# Altium footprint library Tomra_Cadstar_Footprints.PcbLib: 373 footprints (part 21 of 24)
Each footprint in its own frame and in the unit in brackets; x right, y up, seen from the top. Pads: shape width x height; smd on the part's side, far side on the other; paste and mask are expansions set on the pad; w line width, h text height; cw(c..) or ccw(c..) is an arc to the next point about the centre after c.
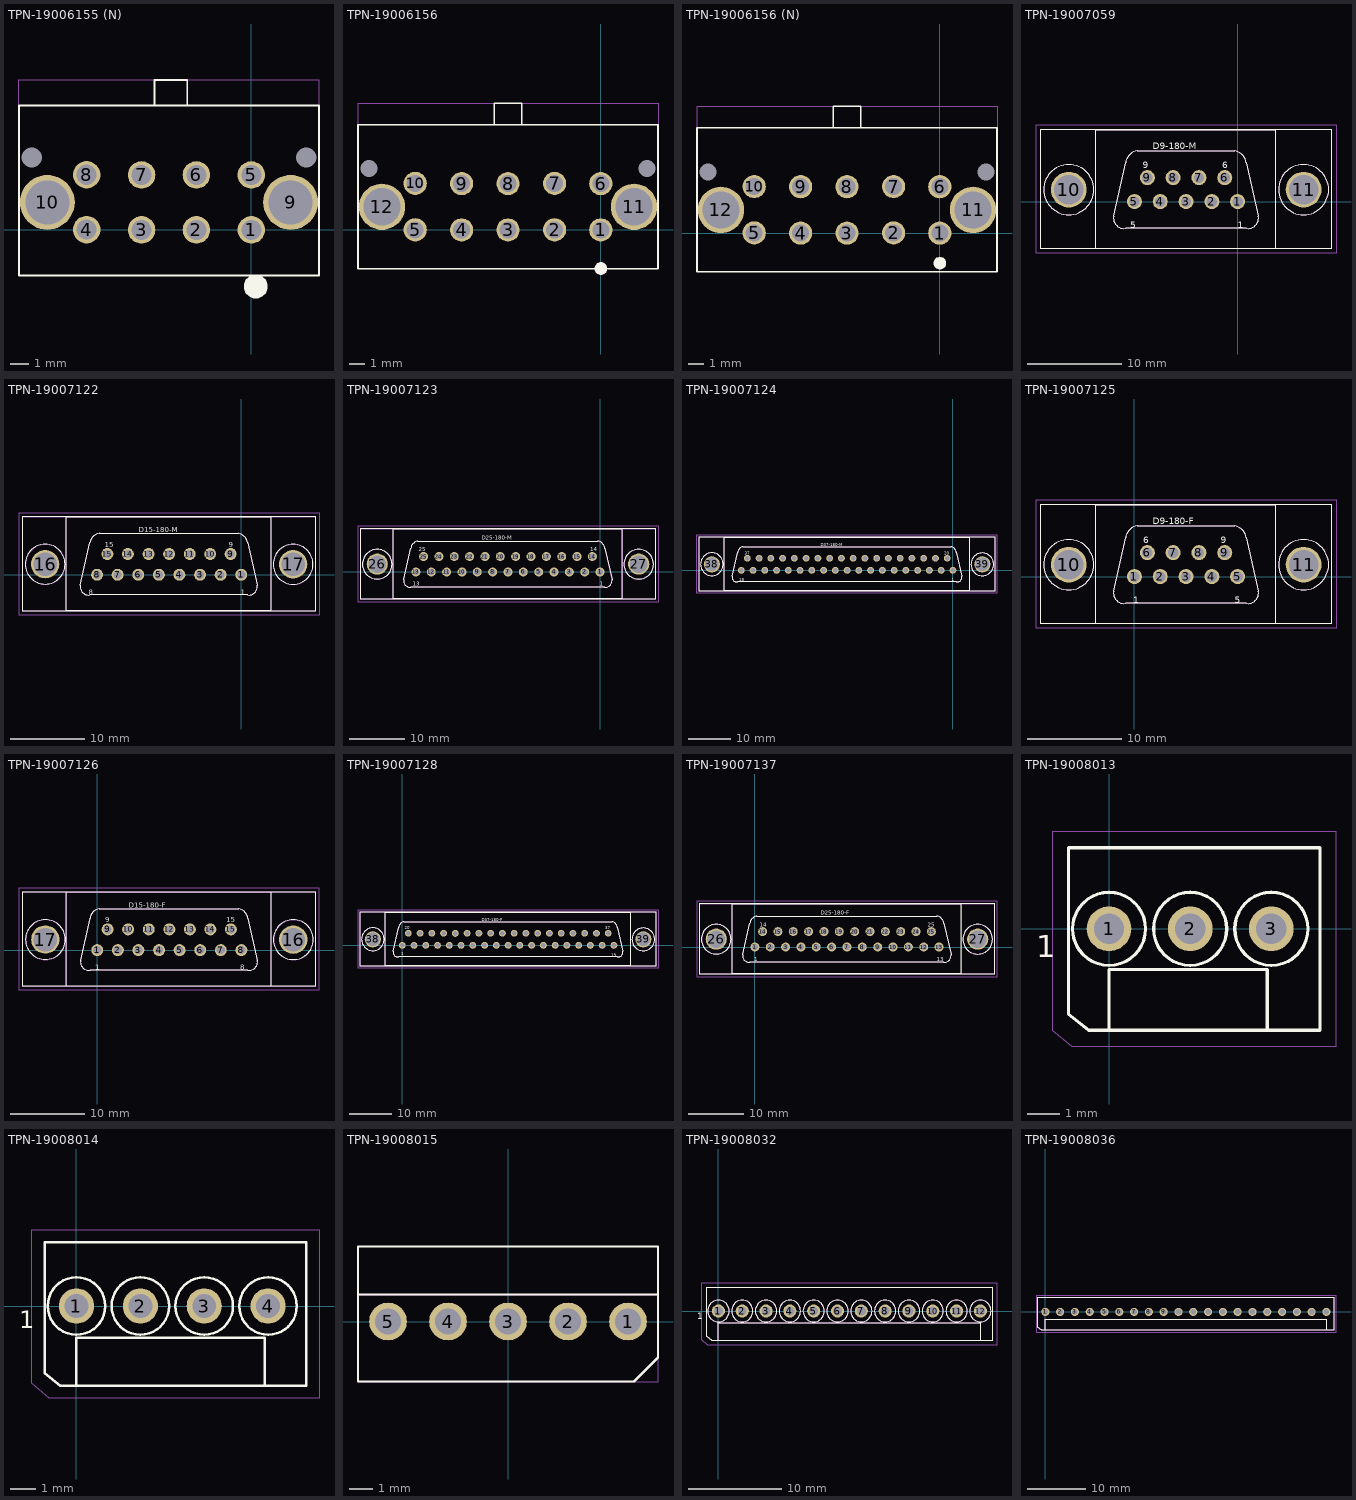
[diagram p20: the footprints below, top view; thin cyan lines are the x and y axes]

## TPN-19006155 (N) [mm]
height 10
pads (12):
  round 1.5 / inner round 1.524 / far side round 1.5 hole 1.1 paste+0 mask+0: 1(0,0) 2(-3,0) 3(-6,0) 4(-9,0.01) 5(0,3) 6(-3,3) 7(-6,3) 8(-9,3.01)
  round 3 / inner round 1.524 / far side round 3 hole 2.4 paste+0 mask+0: 9(2.15,1.5) 10(-11.15,1.5)
  round 0 / inner round 1.524 / far side round 0 hole 1.1 unplated paste+0 mask+0: 11(3,3.96) 12(-12,3.96)
Top Silk:
  region: 0.245,-3.735 0.119,-3.735 -0.115,-3.638 -0.293,-3.46 -0.39,-3.226 -0.39,-2.974 -0.293,-2.74 -0.115,-2.562 0.119,-2.465 0.245,-2.465 0.371,-2.465 0.605,-2.562 0.783,-2.74 0.88,-2.974 0.88,-3.226 0.783,-3.46 0.605,-3.638 0.371,-3.735
  lines w0.1: -12.7,-2.5 3.7,-2.5 3.7,6.8 -12.7,6.8 -12.7,-2.5 ; -5.3,6.8 -3.5,6.8 -3.5,8.2 -5.3,8.2 -5.3,6.8
  text ".Designator" at -12.2,7.3 h0.7
Top Assembly:
  lines w0.05: -12.7,-2.5 3.7,-2.5 3.7,8.2 -12.7,8.2 -12.7,-2.5
Top Placement:
  lines w0.01: -12.7,-2.5 3.7,-2.5 3.7,8.2 -12.7,8.2 -12.7,-2.5

## TPN-19006156 [mm]
height 10
pads (14):
  round 1.5 / inner round 1.524 / far side round 1.5 hole 1.1 paste+0 mask+0: 1(0,0) 2(-2.99,0.01) 3(-6,0) 4(-9,0) 5(-12,0.01) 6(0,3) 7(-2.99,3.01) 8(-6,3) 9(-9,3) 10(-12,3.01)
  round 3 / inner round 1.524 / far side round 3 hole 2.4 paste+0 mask+0: 11(2.15,1.5) 12(-14.15,1.5)
  round 0 / inner round 1.524 / far side round 0 hole 1.1 unplated paste+0 mask+0: 13(3,3.96) 14(-15,3.96)
Top Silk:
  region: 0,-2.9 -0.08,-2.9 -0.227,-2.839 -0.339,-2.727 -0.4,-2.58 -0.4,-2.42 -0.339,-2.273 -0.227,-2.161 -0.08,-2.1 0,-2.1 0.08,-2.1 0.227,-2.161 0.339,-2.273 0.4,-2.42 0.4,-2.58 0.339,-2.727 0.227,-2.839 0.08,-2.9
  lines w0.1: -15.7,-2.5 3.7,-2.5 3.7,6.8 -15.7,6.8 -15.7,-2.5 ; -6.9,6.8 -5.1,6.8 -5.1,8.2 -6.9,8.2 -6.9,6.8
  text ".Designator" at -15.2,7.3 h0.7
Top Assembly:
  lines w0.05: -15.7,-2.5 3.7,-2.5 3.7,8.2 -15.7,8.2 -15.7,-2.5
Top Placement:
  lines w0.01: -15.7,-2.5 3.7,-2.5 3.7,8.2 -15.7,8.2 -15.7,-2.5

## TPN-19006156 (N) [mm]
height 10
pads (14):
  round 1.5 / inner round 1.524 / far side round 1.5 hole 1.1 paste+0 mask+0: 1(0,0) 2(-2.99,0.01) 3(-6,0) 4(-9,0) 5(-12,0.01) 6(0,3) 7(-2.99,3.01) 8(-6,3) 9(-9,3) 10(-12,3.01)
  round 3 / inner round 1.524 / far side round 3 hole 2.4 paste+0 mask+0: 11(2.15,1.5) 12(-14.15,1.5)
  round 0 / inner round 1.524 / far side round 0 hole 1.1 unplated paste+0 mask+0: 13(3,3.96) 14(-15,3.96)
Top Silk:
  region: 0,-2.35 -0.08,-2.35 -0.227,-2.289 -0.339,-2.177 -0.4,-2.03 -0.4,-1.87 -0.339,-1.723 -0.227,-1.611 -0.08,-1.55 0,-1.55 0.08,-1.55 0.227,-1.611 0.339,-1.723 0.4,-1.87 0.4,-2.03 0.339,-2.177 0.227,-2.289 0.08,-2.35
  lines w0.1: -15.7,-2.5 3.7,-2.5 3.7,6.8 -15.7,6.8 -15.7,-2.5 ; -6.9,6.8 -5.1,6.8 -5.1,8.2 -6.9,8.2 -6.9,6.8
  text ".Designator" at -15.2,7.3 h0.7
Top Assembly:
  lines w0.05: -15.7,-2.5 3.7,-2.5 3.7,8.2 -15.7,8.2 -15.7,-2.5
Top Placement:
  lines w0.01: -15.7,-2.5 3.7,-2.5 3.7,8.2 -15.7,8.2 -15.7,-2.5

## TPN-19007059 [mm]
pads (11):
  round 1.6 / inner round 1.524 / far side round 1.6 hole 1.1 paste+0 mask+0: 1(0,0) 2(-2.743,0) 3(-5.486,0) 4(-8.23,0) 5(-10.973,0) 6(-1.372,2.54) 7(-4.115,2.54) 8(-6.858,2.54) 9(-9.601,2.54)
  round 3.8 / inner round 1.524 / far side round 3.8 hole 3.15 paste+0 mask+0: 10(-17.958,1.27) 11(7.01,1.27)
Top Silk:
  lines w0.1: -20.942,-5.011 9.957,-5.011 ; -20.942,-5.011 -20.942,7.689 ; -20.942,-5.011 9.957,-5.011 ; -20.942,-5.011 -20.942,7.689 ; -20.942,7.689 9.957,7.689 ; -20.942,7.689 9.957,7.689 ; -17.958,-1.397 cw(c-17.958,1.27) -17.958,3.937 ; -17.958,-1.397 ccw(c-17.958,1.27) -17.958,3.937 ; -17.958,-1.397 cw(c-17.958,1.27) -17.958,3.937 ; -17.958,-1.397 ccw(c-17.958,1.27) -17.958,3.937 ; -15.1,-4.998 3.988,-4.998 ; -15.1,-4.998 -15.1,7.651 ; -15.1,-4.998 3.988,-4.998 ; -15.1,-4.998 -15.1,7.651 ; -15.1,7.651 3.988,7.651 ; -15.1,7.651 3.988,7.651 ; -13.195,-1.585 ccw(c-12.09,-1.75) -11.925,-2.855 ; -13.195,-1.585 -11.925,4.13 ; -13.195,-1.585 ccw(c-12.09,-1.75) -11.925,-2.855 ; -13.195,-1.585 -11.925,4.13 ; -11.925,-2.855 0.94,-2.855 ; -11.925,-2.855 0.94,-2.855 ; -11.925,4.13 cw(c-10.422,3.897) -10.655,5.4 ; -11.925,4.13 cw(c-10.422,3.897) -10.655,5.4 ; -10.655,5.4 -0.33,5.4 ; -10.655,5.4 -0.33,5.4 ; -0.33,5.4 cw(c-0.647,3.812) 0.94,4.13 ; -0.33,5.4 cw(c-0.647,3.812) 0.94,4.13 ; 0.94,-2.855 ccw(c1.105,-1.75) 2.21,-1.585 ; 0.94,-2.855 ccw(c1.105,-1.75) 2.21,-1.585 ; 0.94,4.13 2.21,-1.585 ; 0.94,4.13 2.21,-1.585 ; 3.988,-4.998 3.988,7.651 ; 3.988,-4.998 3.988,7.651 ; 7.01,-1.397 ccw(c7.01,1.27) 7.01,3.937 ; 7.01,-1.397 cw(c7.01,1.27) 7.01,3.937 ; 7.01,-1.397 ccw(c7.01,1.27) 7.01,3.937 ; 7.01,-1.397 cw(c7.01,1.27) 7.01,3.937 ; 9.957,-5.011 9.957,7.689 ; 9.957,-5.011 9.957,7.689
  text "9" at -10.113,3.54 h0.7
  text "5" at -11.413,-2.855 h0.7
  text "6" at -1.613,3.54 h0.7
  text "1" at -0.013,-2.855 h0.7
  text "D9-180-M" at -9.013,5.54 h0.7
  text ".Designator" at 0,0 h0.7
Top Assembly:
  lines w0.05: -20.942,-5.011 9.957,-5.011 9.957,7.689 -20.942,7.689 -20.942,-5.011 ; -17.958,-1.397 cw(c-17.958,1.27) -17.958,3.937 cw(c-17.958,1.27) -17.958,-1.397 ; -15.1,-4.998 3.988,-4.998 3.988,7.651 -15.1,7.651 -15.1,-4.998 ; -13.195,-1.585 ccw(c-12.09,-1.75) -11.925,-2.855 0.94,-2.855 ccw(c1.105,-1.75) 2.21,-1.585 0.94,4.13 ccw(c-0.647,3.812) -0.33,5.4 -10.655,5.4 ccw(c-10.422,3.897) -11.925,4.13 -13.195,-1.585 ; 7.01,-1.397 ccw(c7.01,1.27) 7.01,3.937 ccw(c7.01,1.27) 7.01,-1.397
  text "9" at -10.113,3.54 h0.7
  text "5" at -11.413,-2.855 h0.7
  text "6" at -1.613,3.54 h0.7
  text "1" at -0.013,-2.855 h0.7
  text "D9-180-M" at -9.013,5.54 h0.7
Top Placement:
  lines w0.01: -21.442,-5.511 10.457,-5.511 10.457,8.189 -21.442,8.189 -21.442,-5.511

## TPN-19007122 [mm]
pads (17):
  round 1.6 / inner round 1.524 / far side round 1.6 hole 1.1 paste+0 mask+0: 1(0,0) 2(-2.76,0) 3(-5.52,0) 4(-8.28,0) 5(-11.04,0) 6(-13.8,0) 7(-16.56,0) 8(-19.32,0) 9(-1.417,2.779) 10(-4.158,2.779) 11(-6.899,2.78) 12(-9.659,2.78) 13(-12.419,2.78) 14(-15.179,2.78) 15(-17.939,2.78)
  round 3.8 / inner round 1.524 / far side round 3.8 hole 3.15 paste+0 mask+0: 16(-26.277,1.42) 17(6.95,1.41)
Top Silk:
  lines w0.1: -29.304,-4.861 9.897,-4.861 9.897,7.839 -29.304,7.839 -29.304,-4.861 ; -26.277,-1.247 cw(c-26.277,1.42) -26.277,4.087 cw(c-26.277,1.42) -26.277,-1.247 ; -23.462,-4.848 3.928,-4.848 3.928,7.801 -23.462,7.801 -23.462,-4.848 ; -21.557,-1.435 ccw(c-20.452,-1.6) -20.287,-2.705 0.88,-2.705 ccw(c1.045,-1.6) 2.15,-1.435 0.88,4.28 ccw(c-0.707,3.962) -0.39,5.55 -19.017,5.55 ccw(c-18.784,4.047) -20.287,4.28 -21.557,-1.435 ; 6.95,-1.257 ccw(c6.95,1.41) 6.95,4.077 ccw(c6.95,1.41) 6.95,-1.257
  text "D15-180-M" at -13.72,5.7 h0.7
  text "8" at -20.42,-2.7 h0.7
  text "1" at -0.045,-2.7 h0.7
  text "15" at -18.32,3.7 h0.7
  text "9" at -1.67,3.675 h0.7
  text ".Designator" at 0,0 h0.7
Top Assembly:
  lines w0.05: -29.278,-4.909 9.923,-4.909 9.923,7.791 -29.278,7.791 -29.278,-4.909 ; -26.251,-1.295 cw(c-26.251,1.372) -26.251,4.039 cw(c-26.251,1.372) -26.251,-1.295 ; -23.436,-4.896 3.954,-4.896 3.954,7.753 -23.436,7.753 -23.436,-4.896 ; -21.557,-1.435 ccw(c-20.452,-1.6) -20.287,-2.705 0.88,-2.705 ccw(c1.045,-1.6) 2.15,-1.435 0.88,4.28 ccw(c-0.707,3.962) -0.39,5.55 -19.017,5.55 ccw(c-18.784,4.047) -20.287,4.28 -21.557,-1.435 ; 6.976,-1.305 ccw(c6.976,1.362) 6.976,4.029 ccw(c6.976,1.362) 6.976,-1.305
  text "D15-180-M" at -13.72,5.7 h0.7
  text "8" at -20.42,-2.7 h0.7
  text "1" at -0.045,-2.7 h0.7
  text "15" at -18.32,3.7 h0.7
  text "9" at -1.67,3.675 h0.7
Top Placement:
  lines w0.01: -29.778,-5.409 10.423,-5.409 10.423,8.291 -29.778,8.291 -29.778,-5.409

## TPN-19007123 [mm]
height 17.5
pads (27):
  round 1.6 / inner round 1.524 / far side round 1.6 hole 1.1 paste+0 mask+0: 1(0,0) 2(-2.76,0) 3(-5.52,0) 4(-8.28,0) 5(-11.04,0) 6(-13.8,0) 7(-16.56,0) 8(-19.32,0) 9(-22.08,0) 10(-24.84,0) 11(-27.6,0) 12(-30.36,0) 13(-33.12,0) 14(-1.38,2.78) 15(-4.14,2.78) 16(-6.9,2.78) 17(-9.66,2.78) 18(-12.42,2.78) 19(-15.18,2.78) 20(-17.94,2.78) 21(-20.7,2.78) 22(-23.46,2.78) 23(-26.22,2.78) 24(-28.98,2.78) 25(-31.74,2.78)
  round 3.8 / inner round 1.524 / far side round 3.8 hole 3.15 paste+0 mask+0: 26(-40.078,1.42) 27(6.95,1.41)
Top Silk:
  lines w0.1: -43.062,-4.864 9.897,-4.864 9.897,7.836 -43.062,7.836 -43.062,-4.864 ; -40.078,-1.247 cw(c-40.078,1.42) -40.078,4.087 cw(c-40.078,1.42) -40.078,-1.247 ; -37.22,-4.851 3.928,-4.851 3.928,7.798 -37.22,7.798 -37.22,-4.851 ; -35.315,-1.435 ccw(c-34.21,-1.6) -34.045,-2.705 0.88,-2.705 ccw(c1.045,-1.6) 2.15,-1.435 0.88,4.28 ccw(c-0.707,3.962) -0.39,5.55 -32.775,5.55 ccw(c-32.542,4.047) -34.045,4.28 -35.315,-1.435 ; 6.95,-1.257 ccw(c6.95,1.41) 6.95,4.077 ccw(c6.95,1.41) 6.95,-1.257
  text "13" at -33.67,-2.5 h0.7
  text "1" at -0.02,-2.5 h0.7
  text "25" at -32.62,3.7 h0.7
  text "14" at -1.77,3.75 h0.7
  text "D25-180-M" at -21.32,5.8 h0.7
  text ".Designator" at 0,0 h0.7
Top Assembly:
  lines w0.05: -43.036,-4.912 9.923,-4.912 9.923,7.788 -43.036,7.788 -43.036,-4.912 ; -40.052,-1.295 cw(c-40.052,1.372) -40.052,4.039 cw(c-40.052,1.372) -40.052,-1.295 ; -37.194,-4.899 3.954,-4.899 3.954,7.75 -37.194,7.75 -37.194,-4.899 ; -35.32,-1.435 ccw(c-34.215,-1.6) -34.05,-2.705 0.875,-2.705 ccw(c1.04,-1.6) 2.145,-1.435 0.875,4.28 ccw(c-0.713,3.962) -0.395,5.55 -32.78,5.55 ccw(c-32.547,4.047) -34.05,4.28 -35.32,-1.435 ; 6.976,-1.308 ccw(c6.976,1.359) 6.976,4.026 ccw(c6.976,1.359) 6.976,-1.308
  text "13" at -33.67,-2.5 h0.7
  text "1" at -0.02,-2.5 h0.7
  text "25" at -32.62,3.7 h0.7
  text "14" at -1.77,3.75 h0.7
  text "D25-180-M" at -21.32,5.8 h0.7
Top Placement:
  lines w0.01: -43.536,-5.412 10.423,-5.412 10.423,8.288 -43.536,8.288 -43.536,-5.412

## TPN-19007124 [mm]
pads (39):
  round 1.6 / inner round 1.524 / far side round 1.6 hole 1.1 paste+0 mask+0: 1(0,0) 2(-2.76,0) 3(-5.52,0) 4(-8.28,0) 5(-11.04,0) 6(-13.8,0) 7(-16.56,0) 8(-19.32,0) 9(-22.08,0) 10(-24.84,0) 11(-27.6,0) 12(-30.36,0) 13(-33.12,0) 14(-35.88,0) 15(-38.64,0) 16(-41.4,0) 17(-44.16,0) 18(-46.92,0) 19(-49.68,0) 20(-1.34,2.84) 21(-4.1,2.84) 22(-6.86,2.84) 23(-9.62,2.84) 24(-12.38,2.84) 25(-15.14,2.84) 26(-17.9,2.84) 27(-20.66,2.84) 28(-23.42,2.84) 29(-26.18,2.84) 30(-28.94,2.84) 31(-31.7,2.84) 32(-34.46,2.84) 33(-37.22,2.84) 34(-39.98,2.84) 35(-42.74,2.84) 36(-45.5,2.84) 37(-48.26,2.84)
  round 3.8 / inner round 1.524 / far side round 3.8 hole 3.15 paste+0 mask+0: 38(-56.59,1.42) 39(6.9,1.41)
Top Silk:
  lines w0.1: -59.574,-4.861 9.847,-4.861 9.847,7.839 -59.574,7.839 -59.574,-4.861 ; -56.59,-1.247 cw(c-56.59,1.42) -56.59,4.087 cw(c-56.59,1.42) -56.59,-1.247 ; -53.732,-4.848 3.878,-4.848 3.878,7.801 -53.732,7.801 -53.732,-4.848 ; -51.827,-1.435 ccw(c-50.722,-1.6) -50.557,-2.705 0.83,-2.705 ccw(c0.995,-1.6) 2.1,-1.435 0.83,4.28 ccw(c-0.757,3.962) -0.44,5.55 -49.287,5.55 ccw(c-49.054,4.047) -50.557,4.28 -51.827,-1.435 ; 6.9,-1.257 ccw(c6.9,1.41) 6.9,4.077 ccw(c6.9,1.41) 6.9,-1.257
  text "20" at -2.02,3.7 h0.7
  text "37" at -48.82,3.7 h0.7
  text "19" at -50.12,-2.6 h0.7
  text "1" at -0.22,-2.6 h0.7
  text "D37-180-M" at -31.02,5.7 h0.7
  text ".Designator" at 0,0 h0.7
Top Assembly:
  lines w0.05: -59.574,-4.861 9.847,-4.861 9.847,7.839 -59.574,7.839 -59.574,-4.861 ; -56.59,-1.247 cw(c-56.59,1.42) -56.59,4.087 cw(c-56.59,1.42) -56.59,-1.247 ; -53.732,-4.848 3.878,-4.848 3.878,7.801 -53.732,7.801 -53.732,-4.848 ; -51.827,-1.435 ccw(c-50.722,-1.6) -50.557,-2.705 0.83,-2.705 ccw(c0.995,-1.6) 2.1,-1.435 0.83,4.28 ccw(c-0.757,3.962) -0.44,5.55 -49.287,5.55 ccw(c-49.054,4.047) -50.557,4.28 -51.827,-1.435 ; 6.9,-1.257 ccw(c6.9,1.41) 6.9,4.077 ccw(c6.9,1.41) 6.9,-1.257
  text "20" at -2.02,3.7 h0.7
  text "37" at -48.82,3.7 h0.7
  text "19" at -50.12,-2.6 h0.7
  text "1" at -0.22,-2.6 h0.7
  text "D37-180-M" at -31.02,5.7 h0.7
Top Placement:
  lines w0.01: -60.074,-5.361 10.347,-5.361 10.347,8.339 -60.074,8.339 -60.074,-5.361

## TPN-19007125 [mm]
pads (11):
  round 1.6 / inner round 1.524 / far side round 1.6 hole 1.1 paste+0 mask+0: 1(0,0) 2(2.743,0) 3(5.486,0) 4(8.23,0) 5(10.973,0) 6(1.372,2.54) 7(4.115,2.54) 8(6.858,2.54) 9(9.601,2.54)
  round 3.8 / inner round 1.524 / far side round 3.8 hole 3.15 paste+0 mask+0: 10(-6.985,1.27) 11(17.983,1.27)
Top Silk:
  lines w0.1: -9.969,-5.011 20.93,-5.011 ; -9.969,-5.011 -9.969,7.689 ; -9.969,-5.011 20.93,-5.011 ; -9.969,-5.011 -9.969,7.689 ; -9.969,7.689 20.93,7.689 ; -9.969,7.689 20.93,7.689 ; -6.985,-1.397 cw(c-6.985,1.27) -6.985,3.937 ; -6.985,-1.397 ccw(c-6.985,1.27) -6.985,3.937 ; -6.985,-1.397 cw(c-6.985,1.27) -6.985,3.937 ; -6.985,-1.397 ccw(c-6.985,1.27) -6.985,3.937 ; -4.127,-4.998 14.961,-4.998 ; -4.127,-4.998 -4.127,7.651 ; -4.127,-4.998 14.961,-4.998 ; -4.127,-4.998 -4.127,7.651 ; -4.127,7.651 14.961,7.651 ; -4.127,7.651 14.961,7.651 ; -2.222,-1.585 ccw(c-1.117,-1.75) -0.952,-2.855 ; -2.222,-1.585 -0.952,4.13 ; -2.222,-1.585 ccw(c-1.117,-1.75) -0.952,-2.855 ; -2.222,-1.585 -0.952,4.13 ; -0.952,-2.855 11.913,-2.855 ; -0.952,-2.855 11.913,-2.855 ; -0.952,4.13 cw(c0.551,3.897) 0.318,5.4 ; -0.952,4.13 cw(c0.551,3.897) 0.318,5.4 ; 0.318,5.4 10.643,5.4 ; 0.318,5.4 10.643,5.4 ; 10.643,5.4 cw(c10.326,3.812) 11.913,4.13 ; 10.643,5.4 cw(c10.326,3.812) 11.913,4.13 ; 11.913,-2.855 ccw(c12.078,-1.75) 13.183,-1.585 ; 11.913,-2.855 ccw(c12.078,-1.75) 13.183,-1.585 ; 11.913,4.13 13.183,-1.585 ; 11.913,4.13 13.183,-1.585 ; 14.961,-4.998 14.961,7.651 ; 14.961,-4.998 14.961,7.651 ; 17.983,-1.397 ccw(c17.983,1.27) 17.983,3.937 ; 17.983,-1.397 cw(c17.983,1.27) 17.983,3.937 ; 17.983,-1.397 ccw(c17.983,1.27) 17.983,3.937 ; 17.983,-1.397 cw(c17.983,1.27) 17.983,3.937 ; 20.93,-5.011 20.93,7.689 ; 20.93,-5.011 20.93,7.689
  text "5" at 10.66,-2.855 h0.7
  text "1" at -0.14,-2.855 h0.7
  text "6" at 0.96,3.54 h0.7
  text "9" at 9.16,3.54 h0.7
  text "D9-180-F" at 1.96,5.54 h0.7
  text ".Designator" at 0,0 h0.7
Top Assembly:
  lines w0.05: -9.969,-5.011 20.93,-5.011 20.93,7.689 -9.969,7.689 -9.969,-5.011 ; -6.985,-1.397 cw(c-6.985,1.27) -6.985,3.937 cw(c-6.985,1.27) -6.985,-1.397 ; -4.127,-4.998 14.961,-4.998 14.961,7.651 -4.127,7.651 -4.127,-4.998 ; -2.222,-1.585 ccw(c-1.117,-1.75) -0.952,-2.855 11.913,-2.855 ccw(c12.078,-1.75) 13.183,-1.585 11.913,4.13 ccw(c10.326,3.812) 10.643,5.4 0.318,5.4 ccw(c0.551,3.897) -0.952,4.13 -2.222,-1.585 ; 17.983,-1.397 ccw(c17.983,1.27) 17.983,3.937 ccw(c17.983,1.27) 17.983,-1.397
  text "5" at 10.66,-2.855 h0.7
  text "1" at -0.14,-2.855 h0.7
  text "6" at 0.96,3.54 h0.7
  text "9" at 9.16,3.54 h0.7
  text "D9-180-F" at 1.96,5.54 h0.7
Top Placement:
  lines w0.01: -10.469,-5.511 21.43,-5.511 21.43,8.189 -10.469,8.189 -10.469,-5.511

## TPN-19007126 [mm]
pads (17):
  round 1.6 / inner round 1.524 / far side round 1.6 hole 1.1 paste+0 mask+0: 1(0,0) 2(2.76,0) 3(5.52,0) 4(8.28,0) 5(11.04,0) 6(13.8,0) 7(16.56,0) 8(19.32,0) 9(1.381,2.78) 10(4.141,2.78) 11(6.901,2.78) 12(9.661,2.78) 13(12.421,2.78) 14(15.162,2.779) 15(17.903,2.779)
  round 3.8 / inner round 1.524 / far side round 3.8 hole 3.15 paste+0 mask+0: 16(26.27,1.41) 17(-6.957,1.42)
Top Silk:
  lines w0.1: -9.984,-4.861 29.217,-4.861 29.217,7.839 -9.984,7.839 -9.984,-4.861 ; -6.957,-1.247 cw(c-6.957,1.42) -6.957,4.087 cw(c-6.957,1.42) -6.957,-1.247 ; -4.142,-4.848 23.248,-4.848 23.248,7.801 -4.142,7.801 -4.142,-4.848 ; -2.237,-1.435 ccw(c-1.132,-1.6) -0.967,-2.705 20.2,-2.705 ccw(c20.365,-1.6) 21.47,-1.435 20.2,4.28 ccw(c18.613,3.962) 18.93,5.55 0.303,5.55 ccw(c0.536,4.047) -0.967,4.28 -2.237,-1.435 ; 26.27,-1.257 ccw(c26.27,1.41) 26.27,4.077 ccw(c26.27,1.41) 26.27,-1.257
  text "8" at 19.16,-2.64 h0.7
  text "9" at 1.1,3.75 h0.7
  text "15" at 17.27,3.75 h0.7
  text "1" at -0.25,-2.64 h0.7
  text "D15-180-F" at 4.2,5.7 h0.7
  text ".Designator" at 0,0 h0.7
Top Assembly:
  lines w0.05: -9.958,-4.909 29.243,-4.909 29.243,7.791 -9.958,7.791 -9.958,-4.909 ; -6.931,-1.295 cw(c-6.931,1.372) -6.931,4.039 cw(c-6.931,1.372) -6.931,-1.295 ; -4.116,-4.896 23.274,-4.896 23.274,7.753 -4.116,7.753 -4.116,-4.896 ; -2.237,-1.435 ccw(c-1.132,-1.6) -0.967,-2.705 20.2,-2.705 ccw(c20.365,-1.6) 21.47,-1.435 20.2,4.28 ccw(c18.613,3.962) 18.93,5.55 0.303,5.55 ccw(c0.536,4.047) -0.967,4.28 -2.237,-1.435 ; 26.296,-1.305 ccw(c26.296,1.362) 26.296,4.029 ccw(c26.296,1.362) 26.296,-1.305
  text "8" at 19.16,-2.64 h0.7
  text "9" at 1.1,3.75 h0.7
  text "15" at 17.27,3.75 h0.7
  text "1" at -0.25,-2.64 h0.7
  text "D15-180-F" at 4.21,5.7 h0.7
Top Placement:
  lines w0.01: -10.484,-5.361 29.717,-5.361 29.717,8.339 -10.484,8.339 -10.484,-5.361

## TPN-19007128 [mm]
pads (39):
  round 1.6 / inner round 1.524 / far side round 1.6 hole 1.1 paste+0 mask+0: 1(0,0) 2(2.76,0) 3(5.52,0) 4(8.28,0) 5(11.04,0) 6(13.8,0) 7(16.56,0) 8(19.32,0) 9(22.08,0) 10(24.84,0) 11(27.6,0) 12(30.36,0) 13(33.12,0) 14(35.88,0) 15(38.64,0) 16(41.4,0) 17(44.16,0) 18(46.92,0) 19(49.68,0) 20(1.42,2.84) 21(4.18,2.84) 22(6.94,2.84) 23(9.7,2.84) 24(12.46,2.8) 25(15.22,2.84) 26(17.98,2.84) 27(20.74,2.84) 28(23.5,2.84) 29(26.26,2.84) 30(29.02,2.84) 31(31.78,2.84) 32(34.54,2.84) 33(37.3,2.84) 34(40.06,2.84) 35(42.82,2.84) 36(45.58,2.84) 37(48.34,2.84)
  round 3.8 / inner round 1.524 / far side round 3.8 hole 3.15 paste+0 mask+0: 38(-6.91,1.42) 39(56.58,1.41)
Top Silk:
  lines w0.1: -9.894,-4.861 59.527,-4.861 59.527,7.839 -9.894,7.839 -9.894,-4.861 ; -6.91,-1.247 cw(c-6.91,1.42) -6.91,4.087 cw(c-6.91,1.42) -6.91,-1.247 ; -4.052,-4.848 53.558,-4.848 53.558,7.801 -4.052,7.801 -4.052,-4.848 ; -2.147,-1.435 ccw(c-1.042,-1.6) -0.877,-2.705 50.51,-2.705 ccw(c50.675,-1.6) 51.78,-1.435 50.51,4.28 ccw(c48.923,3.962) 49.24,5.55 0.393,5.55 ccw(c0.626,4.047) -0.877,4.28 -2.147,-1.435 ; 56.58,-1.257 ccw(c56.58,1.41) 56.58,4.077 ccw(c56.58,1.41) 56.58,-1.257
  text "37" at 47.67,3.77 h0.7
  text "19" at 49.06,-2.65 h0.7
  text "20" at 0.62,3.77 h0.7
  text "1" at -0.22,-2.36 h0.7
  text "D37-180-F" at 18.66,5.7 h0.7
  text ".Designator" at 0,0 h0.7
Top Assembly:
  lines w0.05: -9.894,-4.861 59.527,-4.861 59.527,7.839 -9.894,7.839 -9.894,-4.861 ; -6.91,-1.247 cw(c-6.91,1.42) -6.91,4.087 cw(c-6.91,1.42) -6.91,-1.247 ; -4.052,-4.848 53.558,-4.848 53.558,7.801 -4.052,7.801 -4.052,-4.848 ; -2.147,-1.435 ccw(c-1.042,-1.6) -0.877,-2.705 50.51,-2.705 ccw(c50.675,-1.6) 51.78,-1.435 50.51,4.28 ccw(c48.923,3.962) 49.24,5.55 0.393,5.55 ccw(c0.626,4.047) -0.877,4.28 -2.147,-1.435 ; 56.58,-1.257 ccw(c56.58,1.41) 56.58,4.077 ccw(c56.58,1.41) 56.58,-1.257
  text "37" at 47.61,3.77 h0.7
  text "19" at 49,-2.65 h0.7
  text "20" at 0.56,3.77 h0.7
  text "1" at -0.28,-2.36 h0.7
  text "D37-180-F" at 18.66,5.7 h0.7
Top Placement:
  lines w0.01: -10.394,-5.361 60.027,-5.361 60.027,8.339 -10.394,8.339 -10.394,-5.361

## TPN-19007137 [mm]
height 17.5
pads (27):
  round 1.6 / inner round 1.524 / far side round 1.6 hole 1.1 paste+0 mask+0: 1(0,0) 2(2.76,0) 3(5.52,0) 4(8.28,0) 5(11.04,0) 6(13.8,0) 7(16.56,0) 8(19.32,0) 9(22.08,0) 10(24.84,0) 11(27.6,0) 12(30.36,0) 13(33.12,0) 14(1.38,2.78) 15(4.14,2.78) 16(6.9,2.78) 17(9.66,2.78) 18(12.42,2.78) 19(15.18,2.78) 20(17.94,2.78) 21(20.7,2.78) 22(23.46,2.78) 23(26.22,2.78) 24(28.98,2.78) 25(31.74,2.78)
  round 3.8 / inner round 1.524 / far side round 3.8 hole 3.15 paste+0 mask+0: 26(-6.958,1.42) 27(40.07,1.41)
Top Silk:
  lines w0.1: -9.942,-4.861 43.017,-4.861 43.017,7.839 -9.942,7.839 -9.942,-4.861 ; -6.958,-1.244 cw(c-6.958,1.423) -6.958,4.09 cw(c-6.958,1.423) -6.958,-1.244 ; -4.1,-4.848 37.048,-4.848 37.048,7.801 -4.1,7.801 -4.1,-4.848 ; -2.195,-1.435 ccw(c-1.09,-1.6) -0.925,-2.705 34,-2.705 ccw(c34.165,-1.6) 35.27,-1.435 34,4.28 ccw(c32.413,3.962) 32.73,5.55 0.345,5.55 ccw(c0.578,4.047) -0.925,4.28 -2.195,-1.435 ; 40.07,-1.257 ccw(c40.07,1.41) 40.07,4.077 ccw(c40.07,1.41) 40.07,-1.257
  text "1" at -0.16,-2.58 h0.7
  text "14" at 0.856,3.643 h0.7
  text "13" at 32.733,-2.58 h0.7
  text "25" at 31.082,3.643 h0.7
  text "D25-180-F" at 11.8,5.8 h0.7
  text ".Designator" at 0,0 h0.7
Top Assembly:
  lines w0.05: -9.916,-4.909 43.043,-4.909 43.043,7.791 -9.916,7.791 -9.916,-4.909 ; -6.932,-1.292 cw(c-6.932,1.375) -6.932,4.042 cw(c-6.932,1.375) -6.932,-1.292 ; -4.074,-4.896 37.074,-4.896 37.074,7.753 -4.074,7.753 -4.074,-4.896 ; -2.195,-1.435 ccw(c-1.09,-1.6) -0.925,-2.705 34,-2.705 ccw(c34.165,-1.6) 35.27,-1.435 34,4.28 ccw(c32.413,3.962) 32.73,5.55 0.345,5.55 ccw(c0.578,4.047) -0.925,4.28 -2.195,-1.435 ; 40.096,-1.305 ccw(c40.096,1.362) 40.096,4.029 ccw(c40.096,1.362) 40.096,-1.305
  text "1" at -0.163,-2.578 h0.7
  text "14" at 0.853,3.645 h0.7
  text "13" at 32.73,-2.578 h0.7
  text "25" at 31.079,3.645 h0.7
  text "D25-180-F" at 11.8,5.8 h0.7
Top Placement:
  lines w0.01: -10.416,-5.409 43.543,-5.409 43.543,8.291 -10.416,8.291 -10.416,-5.409

## TPN-19008013 [mm]
height 10
pads (3):
  round 1.4 / inner round 1.524 / far side round 1.4 hole 0.95 paste+0 mask+0: 1(0,0) 2(2.54,0) 3(5.08,0)
Top Silk:
  lines w0.1: 0,-3.175 0,-1.27 4.953,-1.27 4.953,-3.175 ; -1.27,-2.667 -0.635,-3.175 6.604,-3.175 6.604,2.54 -1.27,2.54 -1.27,-2.667 ; 0,-1.143 ccw(c0,0) 0,1.143 ccw(c0,0) 0,-1.143 ; 2.54,-1.143 ccw(c2.54,0) 2.54,1.143 ccw(c2.54,0) 2.54,-1.143 ; 5.08,-1.143 ccw(c5.08,0) 5.08,1.143 ccw(c5.08,0) 5.08,-1.143
  text "1" at -2.286,-0.889 h0.7
  text ".Designator" at 0,0 h0.7
Top Assembly:
  lines w0.05: 0,-3.175 0,-1.27 4.953,-1.27 4.953,-3.175 ; -1.27,-2.667 -0.635,-3.175 6.604,-3.175 6.604,2.54 -1.27,2.54 -1.27,-2.667 ; 0,-1.143 ccw(c0,0) 0,1.143 ccw(c0,0) 0,-1.143 ; 2.54,-1.143 ccw(c2.54,0) 2.54,1.143 ccw(c2.54,0) 2.54,-1.143 ; 5.08,-1.143 ccw(c5.08,0) 5.08,1.143 ccw(c5.08,0) 5.08,-1.143
  text "1" at -2.286,-0.889 h0.7
Top Placement:
  lines w0.01: -1.77,-3.175 -1.17,-3.675 7.104,-3.675 7.104,3.04 -1.77,3.04 -1.77,-3.175

## TPN-19008014 [mm]
pads (4):
  round 1.4 / inner round 1.524 / far side round 1.4 hole 0.95 paste+0 mask+0: 1(0,0) 2(2.54,0) 3(5.08,0) 4(7.62,0)
Top Silk:
  lines w0.1: 0,-3.175 0,-1.27 7.493,-1.27 7.493,-3.175 ; -1.27,-2.667 -0.635,-3.175 9.144,-3.175 9.144,2.54 -1.27,2.54 -1.27,-2.667 ; 0,-1.143 ccw(c0,0) 0,1.143 ccw(c0,0) 0,-1.143 ; 2.54,-1.143 ccw(c2.54,0) 2.54,1.143 ccw(c2.54,0) 2.54,-1.143 ; 5.08,-1.143 ccw(c5.08,0) 5.08,1.143 ccw(c5.08,0) 5.08,-1.143 ; 7.62,-1.143 ccw(c7.62,0) 7.62,1.143 ccw(c7.62,0) 7.62,-1.143
  text "1" at -2.286,-0.889 h0.7
  text ".Designator" at 0,0 h0.7
Top Assembly:
  lines w0.05: 0,-3.175 0,-1.27 7.493,-1.27 7.493,-3.175 ; -1.27,-2.667 -0.635,-3.175 9.144,-3.175 9.144,2.54 -1.27,2.54 -1.27,-2.667 ; 0,-1.143 ccw(c0,0) 0,1.143 ccw(c0,0) 0,-1.143 ; 2.54,-1.143 ccw(c2.54,0) 2.54,1.143 ccw(c2.54,0) 2.54,-1.143 ; 5.08,-1.143 ccw(c5.08,0) 5.08,1.143 ccw(c5.08,0) 5.08,-1.143 ; 7.62,-1.143 ccw(c7.62,0) 7.62,1.143 ccw(c7.62,0) 7.62,-1.143
  text "1" at -2.286,-0.889 h0.7
Top Placement:
  lines w0.01: -1.77,-3.078 -1.074,-3.675 9.644,-3.675 9.644,3.04 -1.77,3.04 -1.77,-3.078
  text "AMP-4" at 1.524,-3.175 h0.7

## TPN-19008015 [mm]
height 13.9
pads (5):
  round 1.6 / inner round 1.524 / far side round 1.6 hole 1.1 paste+0 mask+0: 1(5.08,0) 2(2.54,0) 3(0,0) 4(-2.54,0) 5(-5.08,0)
Top Silk:
  lines w0.1: -6.35,1.143 6.35,1.143 ; -6.35,-2.54 5.334,-2.54 6.35,-1.524 6.35,3.175 -6.35,3.175 -6.35,-2.54
  text ".Designator" at -5.715,3.81 h0.7
Top Assembly:
  lines w0.05: -6.35,1.143 6.35,1.143 ; -6.35,-2.54 5.334,-2.54 6.35,-1.524 6.35,3.175 -6.35,3.175 -6.35,-2.54
Top Placement:
  lines w0.01: -6.35,-2.54 6.35,-2.54 6.35,3.175 -6.35,3.175 -6.35,-2.54

## TPN-19008032 [mm]
pads (12):
  round 1.4 / inner round 1.524 / far side round 1.4 hole 0.95 paste+0 mask+0: 1(0,0) 2(2.54,0) 3(5.08,0) 4(7.62,0) 5(10.16,0) 6(12.7,0) 7(15.24,0) 8(17.78,0) 9(20.32,0) 10(22.86,0) 11(25.4,0) 12(27.94,0)
Top Silk:
  lines w0.1: 0,-3.175 0,-1.27 27.94,-1.27 27.94,-3.175 ; -1.27,-2.667 -0.635,-3.175 29.21,-3.175 29.21,2.54 -1.27,2.54 -1.27,-2.667 ; 0,-1.143 ccw(c0,0) 0,1.143 ccw(c0,0) 0,-1.143 ; 2.54,-1.143 ccw(c2.54,0) 2.54,1.143 ccw(c2.54,0) 2.54,-1.143 ; 5.08,-1.143 ccw(c5.08,0) 5.08,1.143 ccw(c5.08,0) 5.08,-1.143 ; 7.62,-1.143 ccw(c7.62,0) 7.62,1.143 ccw(c7.62,0) 7.62,-1.143 ; 10.16,-1.143 ccw(c10.16,0) 10.16,1.143 ccw(c10.16,0) 10.16,-1.143 ; 12.7,-1.143 ccw(c12.7,0) 12.7,1.143 ccw(c12.7,0) 12.7,-1.143 ; 15.24,-1.143 ccw(c15.24,0) 15.24,1.143 ccw(c15.24,0) 15.24,-1.143 ; 17.78,-1.143 ccw(c17.78,0) 17.78,1.143 ccw(c17.78,0) 17.78,-1.143 ; 20.32,-1.143 ccw(c20.32,0) 20.32,1.143 ccw(c20.32,0) 20.32,-1.143 ; 22.86,-1.143 ccw(c22.86,0) 22.86,1.143 ccw(c22.86,0) 22.86,-1.143 ; 25.4,-1.143 ccw(c25.4,0) 25.4,1.143 ccw(c25.4,0) 25.4,-1.143 ; 27.94,-1.143 ccw(c27.94,0) 27.94,1.143 ccw(c27.94,0) 27.94,-1.143
  text "1" at -2.286,-0.889 h0.7
  text ".Designator" at 0,0 h0.7
Top Assembly:
  lines w0.05: 0,-3.175 0,-1.27 27.94,-1.27 27.94,-3.175 ; -1.27,-2.667 -0.635,-3.175 29.21,-3.175 29.21,2.54 -1.27,2.54 -1.27,-2.667 ; 0,-1.143 ccw(c0,0) 0,1.143 ccw(c0,0) 0,-1.143 ; 2.54,-1.143 ccw(c2.54,0) 2.54,1.143 ccw(c2.54,0) 2.54,-1.143 ; 5.08,-1.143 ccw(c5.08,0) 5.08,1.143 ccw(c5.08,0) 5.08,-1.143 ; 7.62,-1.143 ccw(c7.62,0) 7.62,1.143 ccw(c7.62,0) 7.62,-1.143 ; 10.16,-1.143 ccw(c10.16,0) 10.16,1.143 ccw(c10.16,0) 10.16,-1.143 ; 12.7,-1.143 ccw(c12.7,0) 12.7,1.143 ccw(c12.7,0) 12.7,-1.143 ; 15.24,-1.143 ccw(c15.24,0) 15.24,1.143 ccw(c15.24,0) 15.24,-1.143 ; 17.78,-1.143 ccw(c17.78,0) 17.78,1.143 ccw(c17.78,0) 17.78,-1.143 ; 20.32,-1.143 ccw(c20.32,0) 20.32,1.143 ccw(c20.32,0) 20.32,-1.143 ; 22.86,-1.143 ccw(c22.86,0) 22.86,1.143 ccw(c22.86,0) 22.86,-1.143 ; 25.4,-1.143 ccw(c25.4,0) 25.4,1.143 ccw(c25.4,0) 25.4,-1.143 ; 27.94,-1.143 ccw(c27.94,0) 27.94,1.143 ccw(c27.94,0) 27.94,-1.143
  text "1" at -2.286,-0.889 h0.7
Top Placement:
  lines w0.01: -1.77,-3.078 -1.114,-3.675 29.71,-3.675 29.71,3.04 -1.77,3.04 -1.77,-3.078
  text "AMP MTA-100-12" at 7.62,-3.175 h0.7

## TPN-19008036 [mm]
height 7.9
pads (20):
  round 1.4 / inner round 1.524 / far side round 1.4 hole 0.95 paste+0 mask+0: 1(0,0) 2(2.54,0) 3(5.08,0) 4(7.62,0) 5(10.16,0) 6(12.7,0) 7(15.24,0) 8(17.78,0) 9(20.32,0) 10(22.86,0) 11(25.4,0) 12(27.94,0) 13(30.48,0) 14(33.02,0) 15(35.56,0) 16(38.1,0) 17(40.64,0) 18(43.18,0) 19(45.72,0) 20(48.26,0)
Top Silk:
  lines w0.1: 0,-3.175 0,-1.27 48.26,-1.27 48.26,-3.175 ; -1.27,-2.667 -0.635,-3.175 49.53,-3.175 49.53,2.54 -1.27,2.54 -1.27,-2.667
  text ".Designator" at -1.27,2.54 h0.7
Top Assembly:
  lines w0.05: 0,-3.175 0,-1.27 48.26,-1.27 48.26,-3.175 ; -1.27,-2.667 -0.635,-3.175 49.53,-3.175 49.53,2.54 -1.27,2.54 -1.27,-2.667
Top Placement:
  lines w0.01: -1.6,-3.5 49.9,-3.5 49.9,2.8 -1.6,2.8 -1.6,-3.5